# Altium schematic symbol library jlcpcb_2025_04_capacitors_extended_0805.schlib: 3281 symbols (part 12 of 18) (continued)
## CL21Y475KBBVPNE
designator C?  Capacitance: 4.7uF  (hidden comment: *)
Capacitor, Ceramic (MLCC), 4.7uF, ±10%, 50V, X7S, ±10%, SMD 0805; Manufacturer: Samsung Electro-Mechanics; Manufacturer Part Number: CL21Y475KBBVPNE; Package Size: 0805; JLCPCB Basic Part: No; JLCPCB Part Number: C3882018; Supplier 1: LCSC; Category: Capacitors - MLCC; Supplier Part Number 1: C3882018; Tolerance: ±10%; Voltage Rating: 50V; Temperature Coefficient: X7S; RoHS: Yes; ComponentLink1Description: Datasheet; ComponentLink2Description: JLCPCB Part URL; ComponentLink2URL: https://jlcpcb.com/partdetail/C3882018; ComponentLink3Description: LCSC Part URL; ComponentLink3URL: https://lcsc.com/product-detail/Multilayer-Ceramic-Capacitors-MLCC---SMD-SMT_Samsung-Electro-Mechanics-Samsung-Electro-Mechanics-CL21Y475KBBVPNE_C3882018.html; ComponentLink4Description: Samsung Component Library; ComponentLink4URL: https://weblib.samsungsem.com/mlcc/mlcc-ec.do?partNumber=CL21Y475KBBVPN
footprint CAP-0805 (0805 (2012M) Capacitor)
pins: 1, 2

## CS0805KKX7R0BB104
designator C?  Capacitance: 100nF  (hidden comment: *)
Capacitor, Ceramic (MLCC), 100nF, ±10%, 100V, X7R, ±10%, SMD 0805; Manufacturer: YAGEO; Manufacturer Part Number: CS0805KKX7R0BB104; Package Size: 0805; JLCPCB Basic Part: No; JLCPCB Part Number: C2171846; Supplier 1: LCSC; Category: Capacitors - MLCC; Supplier Part Number 1: C2171846; Tolerance: ±10%; Voltage Rating: 100V; Temperature Coefficient: X7R; RoHS: Yes; ComponentLink1Description: Datasheet; ComponentLink1URL: https://wmsc.lcsc.com/wmsc/upload/file/pdf/v2/lcsc/2202040530_YAGEO-CS0805KKX7R0BB104_C2171846.pdf; ComponentLink2Description: JLCPCB Part URL; ComponentLink2URL: https://jlcpcb.com/partdetail/C2171846; ComponentLink3Description: LCSC Part URL; ComponentLink3URL: https://lcsc.com/product-detail/Multilayer-Ceramic-Capacitors-MLCC---SMD-SMT_YAGEO-YAGEO-CS0805KKX7R0BB104_C2171846.html
footprint CAP-0805 (0805 (2012M) Capacitor)
pins: 1, 2

## CS0805KKX7R7BB225
designator C?  Capacitance: 2.2uF  (hidden comment: *)
Capacitor, Ceramic (MLCC), 2.2uF, ±10%, 16V, X7R, ±10%, SMD 0805; Manufacturer: YAGEO; Manufacturer Part Number: CS0805KKX7R7BB225; Package Size: 0805; JLCPCB Basic Part: No; JLCPCB Part Number: C577425; Supplier 1: LCSC; Category: Capacitors - MLCC; Supplier Part Number 1: C577425; Tolerance: ±10%; Voltage Rating: 16V; Temperature Coefficient: X7R; RoHS: Yes; ComponentLink1Description: Datasheet; ComponentLink1URL: https://wmsc.lcsc.com/wmsc/upload/file/pdf/v2/lcsc/2209061800_YAGEO-CS0805KKX7R7BB225_C577425.pdf; ComponentLink2Description: JLCPCB Part URL; ComponentLink2URL: https://jlcpcb.com/partdetail/C577425; ComponentLink3Description: LCSC Part URL; ComponentLink3URL: https://lcsc.com/product-detail/Multilayer-Ceramic-Capacitors-MLCC---SMD-SMT_YAGEO-YAGEO-CS0805KKX7R7BB225_C577425.html
footprint CAP-0805 (0805 (2012M) Capacitor)
pins: 1, 2

## CS0805KKX7R8BB105
designator C?  Capacitance: 1uF  (hidden comment: *)
Capacitor, Ceramic (MLCC), 1uF, ±10%, 25V, X7R, ±10%, SMD 0805; Manufacturer: YAGEO; Manufacturer Part Number: CS0805KKX7R8BB105; Package Size: 0805; JLCPCB Basic Part: No; JLCPCB Part Number: C272869; Supplier 1: LCSC; Category: Capacitors - MLCC; Supplier Part Number 1: C272869; Tolerance: ±10%; Voltage Rating: 25V; Temperature Coefficient: X7R; RoHS: Yes; ComponentLink1Description: Datasheet; ComponentLink1URL: https://wmsc.lcsc.com/wmsc/upload/file/pdf/v2/lcsc/2304140030_YAGEO-CS0805KKX7R8BB105_C272869.pdf; ComponentLink2Description: JLCPCB Part URL; ComponentLink2URL: https://jlcpcb.com/partdetail/C272869; ComponentLink3Description: LCSC Part URL; ComponentLink3URL: https://lcsc.com/product-detail/Multilayer-Ceramic-Capacitors-MLCC---SMD-SMT_YAGEO-YAGEO-CS0805KKX7R8BB105_C272869.html
footprint CAP-0805 (0805 (2012M) Capacitor)
pins: 1, 2

## CS0805KRX7R9BB103
designator C?  Capacitance: 10nF  (hidden comment: *)
Capacitor, Ceramic (MLCC), 10nF, ±10%, 50V, X7R, ±10%, SMD 0805; Manufacturer: YAGEO; Manufacturer Part Number: CS0805KRX7R9BB103; Package Size: 0805; JLCPCB Basic Part: No; JLCPCB Part Number: C326783; Supplier 1: LCSC; Category: Capacitors - MLCC; Supplier Part Number 1: C326783; Tolerance: ±10%; Voltage Rating: 50V; Temperature Coefficient: X7R; RoHS: Yes; ComponentLink1Description: Datasheet; ComponentLink1URL: https://wmsc.lcsc.com/wmsc/upload/file/pdf/v2/lcsc/1811151648_YAGEO-CS0805KRX7R9BB103_C326783.pdf; ComponentLink2Description: JLCPCB Part URL; ComponentLink2URL: https://jlcpcb.com/partdetail/C326783; ComponentLink3Description: LCSC Part URL; ComponentLink3URL: https://lcsc.com/product-detail/Multilayer-Ceramic-Capacitors-MLCC---SMD-SMT_YAGEO-YAGEO-CS0805KRX7R9BB103_C326783.html
footprint CAP-0805 (0805 (2012M) Capacitor)
pins: 1, 2

## CS0805KRX7RCBB102
designator C?  Capacitance: 1nF  (hidden comment: *)
Capacitor, Ceramic (MLCC), 1nF, ±10%, 1kV, X7R, ±10%, SMD 0805; Manufacturer: YAGEO; Manufacturer Part Number: CS0805KRX7RCBB102; Package Size: 0805; JLCPCB Basic Part: No; JLCPCB Part Number: C1855388; Supplier 1: LCSC; Category: Capacitors - MLCC; Supplier Part Number 1: C1855388; Tolerance: ±10%; Voltage Rating: 1kV; Temperature Coefficient: X7R; RoHS: Yes; ComponentLink1Description: Datasheet; ComponentLink1URL: https://wmsc.lcsc.com/wmsc/upload/file/pdf/v2/lcsc/2201271230_YAGEO-CS0805KRX7RCBB102_C1855388.pdf; ComponentLink2Description: JLCPCB Part URL; ComponentLink2URL: https://jlcpcb.com/partdetail/C1855388; ComponentLink3Description: LCSC Part URL; ComponentLink3URL: https://lcsc.com/product-detail/Multilayer-Ceramic-Capacitors-MLCC---SMD-SMT_YAGEO-YAGEO-CS0805KRX7RCBB102_C1855388.html
footprint CAP-0805 (0805 (2012M) Capacitor)
pins: 1, 2

## CS2012X5R225K500NRE
designator C?  Capacitance: 2.2uF  (hidden comment: *)
Capacitor, Ceramic (MLCC), 2.2uF, ±10%, 50V, X5R, ±10%, SMD 0805; Manufacturer: Samwha Capacitor; Manufacturer Part Number: CS2012X5R225K500NRE; Package Size: 0805; JLCPCB Basic Part: No; JLCPCB Part Number: C513763; Supplier 1: LCSC; Category: Capacitors - MLCC; Supplier Part Number 1: C513763; Tolerance: ±10%; Voltage Rating: 50V; Temperature Coefficient: X5R; RoHS: Yes; ComponentLink1Description: Datasheet; ComponentLink1URL: https://wmsc.lcsc.com/wmsc/upload/file/pdf/v2/lcsc/2304140030_Samwha-Capacitor-CS2012X5R225K500NRE_C513763.pdf; ComponentLink2Description: JLCPCB Part URL; ComponentLink2URL: https://jlcpcb.com/partdetail/C513763; ComponentLink3Description: LCSC Part URL; ComponentLink3URL: https://lcsc.com/product-detail/Multilayer-Ceramic-Capacitors-MLCC---SMD-SMT_Samwha-Capacitor-Samwha-Capacitor-CS2012X5R225K500NRE_C513763.html
footprint CAP-0805 (0805 (2012M) Capacitor)
pins: 1, 2

## CS2012X5R226M160NRE
designator C?  Capacitance: 22uF  (hidden comment: *)
Capacitor, Ceramic (MLCC), 22uF, 16V, X5R, SMD 0805; Manufacturer: Samwha Capacitor; Manufacturer Part Number: CS2012X5R226M160NRE; Package Size: 0805; JLCPCB Basic Part: No; JLCPCB Part Number: C2918507; Supplier 1: LCSC; Category: Capacitors - MLCC; Supplier Part Number 1: C2918507; Voltage Rating: 16V; Temperature Coefficient: X5R; RoHS: Yes; ComponentLink1Description: Datasheet; ComponentLink1URL: https://wmsc.lcsc.com/wmsc/upload/file/pdf/v2/lcsc/2111172030_Samwha-Capacitor-CS2012X5R226M160NRE_C2918507.pdf; ComponentLink2Description: JLCPCB Part URL; ComponentLink2URL: https://jlcpcb.com/partdetail/C2918507; ComponentLink3Description: LCSC Part URL; ComponentLink3URL: https://lcsc.com/product-detail/Multilayer-Ceramic-Capacitors-MLCC---SMD-SMT_Samwha-Capacitor-Samwha-Capacitor-CS2012X5R226M160NRE_C2918507.html
footprint CAP-0805 (0805 (2012M) Capacitor)
pins: 1, 2

## CS2012X5R475K250NRE
designator C?  Capacitance: 4.7uF  (hidden comment: *)
Capacitor, Ceramic (MLCC), 4.7uF, ±10%, 25V, X5R, ±10%, SMD 0805; Manufacturer: Samwha Capacitor; Manufacturer Part Number: CS2012X5R475K250NRE; Package Size: 0805; JLCPCB Basic Part: No; JLCPCB Part Number: C2918489; Supplier 1: LCSC; Category: Capacitors - MLCC; Supplier Part Number 1: C2918489; Tolerance: ±10%; Voltage Rating: 25V; Temperature Coefficient: X5R; RoHS: Yes; ComponentLink1Description: Datasheet; ComponentLink1URL: https://wmsc.lcsc.com/wmsc/upload/file/pdf/v2/lcsc/2111172030_Samwha-Capacitor-CS2012X5R475K250NRE_C2918489.pdf; ComponentLink2Description: JLCPCB Part URL; ComponentLink2URL: https://jlcpcb.com/partdetail/C2918489; ComponentLink3Description: LCSC Part URL; ComponentLink3URL: https://lcsc.com/product-detail/Multilayer-Ceramic-Capacitors-MLCC---SMD-SMT_Samwha-Capacitor-Samwha-Capacitor-CS2012X5R475K250NRE_C2918489.html
footprint CAP-0805 (0805 (2012M) Capacitor)
pins: 1, 2

## CS2012X5R475K500NRE
designator C?  Capacitance: 4.7uF  (hidden comment: *)
Capacitor, Ceramic (MLCC), 4.7uF, ±10%, 50V, X5R, ±10%, SMD 0805; Manufacturer: Samwha Capacitor; Manufacturer Part Number: CS2012X5R475K500NRE; Package Size: 0805; JLCPCB Basic Part: No; JLCPCB Part Number: C513770; Supplier 1: LCSC; Category: Capacitors - MLCC; Supplier Part Number 1: C513770; Tolerance: ±10%; Voltage Rating: 50V; Temperature Coefficient: X5R; RoHS: Yes; ComponentLink1Description: Datasheet; ComponentLink1URL: https://wmsc.lcsc.com/wmsc/upload/file/pdf/v2/lcsc/2304140030_Samwha-Capacitor-CS2012X5R475K500NRE_C513770.pdf; ComponentLink2Description: JLCPCB Part URL; ComponentLink2URL: https://jlcpcb.com/partdetail/C513770; ComponentLink3Description: LCSC Part URL; ComponentLink3URL: https://lcsc.com/product-detail/Multilayer-Ceramic-Capacitors-MLCC---SMD-SMT_Samwha-Capacitor-Samwha-Capacitor-CS2012X5R475K500NRE_C513770.html
footprint CAP-0805 (0805 (2012M) Capacitor)
pins: 1, 2

## CS2012X7R104K500NRB
designator C?  Capacitance: 100nF  (hidden comment: *)
Capacitor, Ceramic (MLCC), 100nF, ±10%, 50V, X7R, ±10%, SMD 0805; Manufacturer: Samwha Capacitor; Manufacturer Part Number: CS2012X7R104K500NRB; Package Size: 0805; JLCPCB Basic Part: No; JLCPCB Part Number: C2909631; Supplier 1: LCSC; Category: Capacitors - MLCC; Supplier Part Number 1: C2909631; Tolerance: ±10%; Voltage Rating: 50V; Temperature Coefficient: X7R; RoHS: Yes; ComponentLink1Description: Datasheet; ComponentLink1URL: https://wmsc.lcsc.com/wmsc/upload/file/pdf/v2/lcsc/2110272130_Samwha-Capacitor-CS2012X7R104K500NRB_C2909631.pdf; ComponentLink2Description: JLCPCB Part URL; ComponentLink2URL: https://jlcpcb.com/partdetail/C2909631; ComponentLink3Description: LCSC Part URL; ComponentLink3URL: https://lcsc.com/product-detail/Multilayer-Ceramic-Capacitors-MLCC---SMD-SMT_Samwha-Capacitor-Samwha-Capacitor-CS2012X7R104K500NRB_C2909631.html
footprint CAP-0805 (0805 (2012M) Capacitor)
pins: 1, 2

## CS2012X7R105K500NRE
designator C?  Capacitance: 1uF  (hidden comment: *)
Capacitor, Ceramic (MLCC), 1uF, ±10%, 50V, X7R, ±10%, SMD 0805; Manufacturer: Samwha Capacitor; Manufacturer Part Number: CS2012X7R105K500NRE; Package Size: 0805; JLCPCB Basic Part: No; JLCPCB Part Number: C516002; Supplier 1: LCSC; Category: Capacitors - MLCC; Supplier Part Number 1: C516002; Tolerance: ±10%; Voltage Rating: 50V; Temperature Coefficient: X7R; RoHS: Yes; ComponentLink1Description: Datasheet; ComponentLink1URL: https://wmsc.lcsc.com/wmsc/upload/file/pdf/v2/lcsc/2304140030_Samwha-Capacitor-CS2012X7R105K500NRE_C516002.pdf; ComponentLink2Description: JLCPCB Part URL; ComponentLink2URL: https://jlcpcb.com/partdetail/C516002; ComponentLink3Description: LCSC Part URL; ComponentLink3URL: https://lcsc.com/product-detail/Multilayer-Ceramic-Capacitors-MLCC---SMD-SMT_Samwha-Capacitor-Samwha-Capacitor-CS2012X7R105K500NRE_C516002.html
footprint CAP-0805 (0805 (2012M) Capacitor)
pins: 1, 2

## CS2012X7R106K100NRE
designator C?  Capacitance: 10uF  (hidden comment: *)
Capacitor, Ceramic (MLCC), 10uF, ±10%, 10V, ±10%, SMD 0805; Manufacturer: Samwha Capacitor; Manufacturer Part Number: CS2012X7R106K100NRE; Package Size: 0805; JLCPCB Basic Part: No; JLCPCB Part Number: C1222438; Supplier 1: LCSC; Category: Capacitors - MLCC; Supplier Part Number 1: C1222438; Tolerance: ±10%; Voltage Rating: 10V; RoHS: Yes; ComponentLink1Description: Datasheet; ComponentLink1URL: https://wmsc.lcsc.com/wmsc/upload/file/pdf/v2/lcsc/2012172040_Samwha-Capacitor-CS2012X7R106K100NRE_C1222438.pdf; ComponentLink2Description: JLCPCB Part URL; ComponentLink2URL: https://jlcpcb.com/partdetail/C1222438; ComponentLink3Description: LCSC Part URL; ComponentLink3URL: https://lcsc.com/product-detail/Multilayer-Ceramic-Capacitors-MLCC---SMD-SMT_Samwha-Capacitor-Samwha-Capacitor-CS2012X7R106K100NRE_C1222438.html
footprint CAP-0805 (0805 (2012M) Capacitor)
pins: 1, 2

## CS2012X7R106M100NRE
designator C?  Capacitance: 10uF  (hidden comment: *)
Capacitor, Ceramic (MLCC), 10uF, ±20%, 10V, X7R, ±20%, SMD 0805; Manufacturer: Samwha Capacitor; Manufacturer Part Number: CS2012X7R106M100NRE; Package Size: 0805; JLCPCB Basic Part: No; JLCPCB Part Number: C5189822; Supplier 1: LCSC; Category: Capacitors - MLCC; Supplier Part Number 1: C5189822; Tolerance: ±20%; Voltage Rating: 10V; Temperature Coefficient: X7R; RoHS: Yes; ComponentLink1Description: Datasheet; ComponentLink1URL: https://wmsc.lcsc.com/wmsc/upload/file/pdf/v2/lcsc/2210121101_Samwha-Capacitor-CS2012X7R106M100NRE_C5189822.pdf; ComponentLink2Description: JLCPCB Part URL; ComponentLink2URL: https://jlcpcb.com/partdetail/C5189822; ComponentLink3Description: LCSC Part URL; ComponentLink3URL: https://lcsc.com/product-detail/Multilayer-Ceramic-Capacitors-MLCC---SMD-SMT_Samwha-Capacitor-Samwha-Capacitor-CS2012X7R106M100NRE_C5189822.html
footprint CAP-0805 (0805 (2012M) Capacitor)
pins: 1, 2

## CS2012X7R224K500NRE
designator C?  Capacitance: 220nF  (hidden comment: *)
Capacitor, Ceramic (MLCC), 220nF, ±10%, 50V, X7R, ±10%, SMD 0805; Manufacturer: Samwha Capacitor; Manufacturer Part Number: CS2012X7R224K500NRE; Package Size: 0805; JLCPCB Basic Part: No; JLCPCB Part Number: C2909632; Supplier 1: LCSC; Category: Capacitors - MLCC; Supplier Part Number 1: C2909632; Tolerance: ±10%; Voltage Rating: 50V; Temperature Coefficient: X7R; RoHS: Yes; ComponentLink1Description: Datasheet; ComponentLink1URL: https://wmsc.lcsc.com/wmsc/upload/file/pdf/v2/lcsc/2110272130_Samwha-Capacitor-CS2012X7R224K500NRE_C2909632.pdf; ComponentLink2Description: JLCPCB Part URL; ComponentLink2URL: https://jlcpcb.com/partdetail/C2909632; ComponentLink3Description: LCSC Part URL; ComponentLink3URL: https://lcsc.com/product-detail/Multilayer-Ceramic-Capacitors-MLCC---SMD-SMT_Samwha-Capacitor-Samwha-Capacitor-CS2012X7R224K500NRE_C2909632.html
footprint CAP-0805 (0805 (2012M) Capacitor)
pins: 1, 2

## CS2012X7R225K250NRE
designator C?  Capacitance: 2.2uF  (hidden comment: *)
Capacitor, Ceramic (MLCC), 2.2uF, ±10%, 25V, ±10%, SMD 0805; Manufacturer: Samwha Capacitor; Manufacturer Part Number: CS2012X7R225K250NRE; Package Size: 0805; JLCPCB Basic Part: No; JLCPCB Part Number: C513773; Supplier 1: LCSC; Category: Capacitors - MLCC; Supplier Part Number 1: C513773; Tolerance: ±10%; Voltage Rating: 25V; RoHS: Yes; ComponentLink1Description: Datasheet; ComponentLink1URL: https://wmsc.lcsc.com/wmsc/upload/file/pdf/v2/lcsc/2012171837_Samwha-Capacitor-CS2012X7R225K250NRE_C513773.pdf; ComponentLink2Description: JLCPCB Part URL; ComponentLink2URL: https://jlcpcb.com/partdetail/C513773; ComponentLink3Description: LCSC Part URL; ComponentLink3URL: https://lcsc.com/product-detail/Multilayer-Ceramic-Capacitors-MLCC---SMD-SMT_Samwha-Capacitor-Samwha-Capacitor-CS2012X7R225K250NRE_C513773.html
footprint CAP-0805 (0805 (2012M) Capacitor)
pins: 1, 2

## CS2012X7R334K500NRE
designator C?  Capacitance: 330nF  (hidden comment: *)
Capacitor, Ceramic (MLCC), 330nF, ±10%, 50V, X7R, ±10%, SMD 0805; Manufacturer: Samwha Capacitor; Manufacturer Part Number: CS2012X7R334K500NRE; Package Size: 0805; JLCPCB Basic Part: No; JLCPCB Part Number: C2985038; Supplier 1: LCSC; Category: Capacitors - MLCC; Supplier Part Number 1: C2985038; Tolerance: ±10%; Voltage Rating: 50V; Temperature Coefficient: X7R; RoHS: Yes; ComponentLink1Description: Datasheet; ComponentLink1URL: https://wmsc.lcsc.com/wmsc/upload/file/pdf/v2/lcsc/2206061700_Samwha-Capacitor-CS2012X7R334K500NRE_C2985038.pdf; ComponentLink2Description: JLCPCB Part URL; ComponentLink2URL: https://jlcpcb.com/partdetail/C2985038; ComponentLink3Description: LCSC Part URL; ComponentLink3URL: https://lcsc.com/product-detail/Multilayer-Ceramic-Capacitors-MLCC---SMD-SMT_Samwha-Capacitor-Samwha-Capacitor-CS2012X7R334K500NRE_C2985038.html
footprint CAP-0805 (0805 (2012M) Capacitor)
pins: 1, 2

## CS2012X7R474K500NRE
designator C?  Capacitance: 470nF  (hidden comment: *)
Capacitor, Ceramic (MLCC), 470nF, 50V, X7R, SMD 0805; Manufacturer: Samwha Capacitor; Manufacturer Part Number: CS2012X7R474K500NRE; Package Size: 0805; JLCPCB Basic Part: No; JLCPCB Part Number: C2909633; Supplier 1: LCSC; Category: Capacitors - MLCC; Supplier Part Number 1: C2909633; Voltage Rating: 50V; Temperature Coefficient: X7R; RoHS: Yes; ComponentLink1Description: Datasheet; ComponentLink1URL: https://wmsc.lcsc.com/wmsc/upload/file/pdf/v2/lcsc/2110272130_Samwha-Capacitor-CS2012X7R474K500NRE_C2909633.pdf; ComponentLink2Description: JLCPCB Part URL; ComponentLink2URL: https://jlcpcb.com/partdetail/C2909633; ComponentLink3Description: LCSC Part URL; ComponentLink3URL: https://lcsc.com/product-detail/Multilayer-Ceramic-Capacitors-MLCC---SMD-SMT_Samwha-Capacitor-Samwha-Capacitor-CS2012X7R474K500NRE_C2909633.html
footprint CAP-0805 (0805 (2012M) Capacitor)
pins: 1, 2

## CS2012X7R475K250NRE
designator C?  Capacitance: 4.7uF  (hidden comment: *)
Capacitor, Ceramic (MLCC), 4.7uF, ±10%, 25V, X7R, ±10%, SMD 0805; Manufacturer: Samwha Capacitor; Manufacturer Part Number: CS2012X7R475K250NRE; Package Size: 0805; JLCPCB Basic Part: No; JLCPCB Part Number: C513766; Supplier 1: LCSC; Category: Capacitors - MLCC; Supplier Part Number 1: C513766; Tolerance: ±10%; Voltage Rating: 25V; Temperature Coefficient: X7R; RoHS: Yes; ComponentLink1Description: Datasheet; ComponentLink1URL: https://wmsc.lcsc.com/wmsc/upload/file/pdf/v2/lcsc/2005291832_Samwha-Capacitor-CS2012X7R475K250NRE_C513766.pdf; ComponentLink2Description: JLCPCB Part URL; ComponentLink2URL: https://jlcpcb.com/partdetail/C513766; ComponentLink3Description: LCSC Part URL; ComponentLink3URL: https://lcsc.com/product-detail/Multilayer-Ceramic-Capacitors-MLCC---SMD-SMT_Samwha-Capacitor-Samwha-Capacitor-CS2012X7R475K250NRE_C513766.html
footprint CAP-0805 (0805 (2012M) Capacitor)
pins: 1, 2

## CS2012X7R475K350NRE
designator C?  Capacitance: 4.7uF  (hidden comment: *)
Capacitor, Ceramic (MLCC), 4.7uF, ±10%, 35V, X7R, ±10%, SMD 0805; Manufacturer: Samwha Capacitor; Manufacturer Part Number: CS2012X7R475K350NRE; Package Size: 0805; JLCPCB Basic Part: No; JLCPCB Part Number: C560882; Supplier 1: LCSC; Category: Capacitors - MLCC; Supplier Part Number 1: C560882; Tolerance: ±10%; Voltage Rating: 35V; Temperature Coefficient: X7R; RoHS: Yes; ComponentLink1Description: Datasheet; ComponentLink1URL: https://wmsc.lcsc.com/wmsc/upload/file/pdf/v2/lcsc/2005300141_Samwha-Capacitor-CS2012X7R475K350NRE_C560882.pdf; ComponentLink2Description: JLCPCB Part URL; ComponentLink2URL: https://jlcpcb.com/partdetail/C560882; ComponentLink3Description: LCSC Part URL; ComponentLink3URL: https://lcsc.com/product-detail/Multilayer-Ceramic-Capacitors-MLCC---SMD-SMT_Samwha-Capacitor-Samwha-Capacitor-CS2012X7R475K350NRE_C560882.html
footprint CAP-0805 (0805 (2012M) Capacitor)
pins: 1, 2

## CSA0805X5R106K160MT
designator C?  Capacitance: 10000000pF  (hidden comment: *)
Capacitor, Ceramic (MLCC), 10000000pF, ±10%, 16V, X5R, ±10%, SMD 0805; Manufacturer: HRE; Manufacturer Part Number: CSA0805X5R106K160MT; Package Size: 0805; JLCPCB Basic Part: No; JLCPCB Part Number: C3015161; Supplier 1: LCSC; Category: Capacitors - MLCC; Supplier Part Number 1: C3015161; Tolerance: ±10%; Voltage Rating: 16V; Temperature Coefficient: X5R; RoHS: Yes; ComponentLink1Description: Datasheet; ComponentLink1URL: https://wmsc.lcsc.com/wmsc/upload/file/pdf/v2/lcsc/2208051100_HRE-CSA0805X5R106K160MT_C3015161.pdf; ComponentLink2Description: JLCPCB Part URL; ComponentLink2URL: https://jlcpcb.com/partdetail/C3015161; ComponentLink3Description: LCSC Part URL; ComponentLink3URL: https://lcsc.com/product-detail/Multilayer-Ceramic-Capacitors-MLCC---SMD-SMT_HRE-HRE-CSA0805X5R106K160MT_C3015161.html
footprint CAP-0805 (0805 (2012M) Capacitor)
pins: 1, 2

## CSA0805X5R226M6R3MT
designator C?  Capacitance: 22uF  (hidden comment: *)
Capacitor, Ceramic (MLCC), 22uF, ±20%, 6.3V, X5R, ±20%, SMD 0805; Manufacturer: HRE; Manufacturer Part Number: CSA0805X5R226M6R3MT; Package Size: 0805; JLCPCB Basic Part: No; JLCPCB Part Number: C3015162; Supplier 1: LCSC; Category: Capacitors - MLCC; Supplier Part Number 1: C3015162; Tolerance: ±20%; Voltage Rating: 6.3V; Temperature Coefficient: X5R; RoHS: Yes; ComponentLink1Description: Datasheet; ComponentLink1URL: https://wmsc.lcsc.com/wmsc/upload/file/pdf/v2/lcsc/2208051100_HRE-CSA0805X5R226M6R3MT_C3015162.pdf; ComponentLink2Description: JLCPCB Part URL; ComponentLink2URL: https://jlcpcb.com/partdetail/C3015162; ComponentLink3Description: LCSC Part URL; ComponentLink3URL: https://lcsc.com/product-detail/Multilayer-Ceramic-Capacitors-MLCC---SMD-SMT_HRE-HRE-CSA0805X5R226M6R3MT_C3015162.html
footprint CAP-0805 (0805 (2012M) Capacitor)
pins: 1, 2

## CSA0805X7R103K500KT
designator C?  Capacitance: 10nF  (hidden comment: *)
Capacitor, Ceramic (MLCC), 10nF, ±10%, 50V, X7R, ±10%, SMD 0805; Manufacturer: HRE; Manufacturer Part Number: CSA0805X7R103K500KT; Package Size: 0805; JLCPCB Basic Part: No; JLCPCB Part Number: C3015138; Supplier 1: LCSC; Category: Capacitors - MLCC; Supplier Part Number 1: C3015138; Tolerance: ±10%; Voltage Rating: 50V; Temperature Coefficient: X7R; RoHS: Yes; ComponentLink1Description: Datasheet; ComponentLink1URL: https://wmsc.lcsc.com/wmsc/upload/file/pdf/v2/lcsc/2208051100_HRE-CSA0805X7R103K500KT_C3015138.pdf; ComponentLink2Description: JLCPCB Part URL; ComponentLink2URL: https://jlcpcb.com/partdetail/C3015138; ComponentLink3Description: LCSC Part URL; ComponentLink3URL: https://lcsc.com/product-detail/Multilayer-Ceramic-Capacitors-MLCC---SMD-SMT_HRE-HRE-CSA0805X7R103K500KT_C3015138.html
footprint CAP-0805 (0805 (2012M) Capacitor)
pins: 1, 2

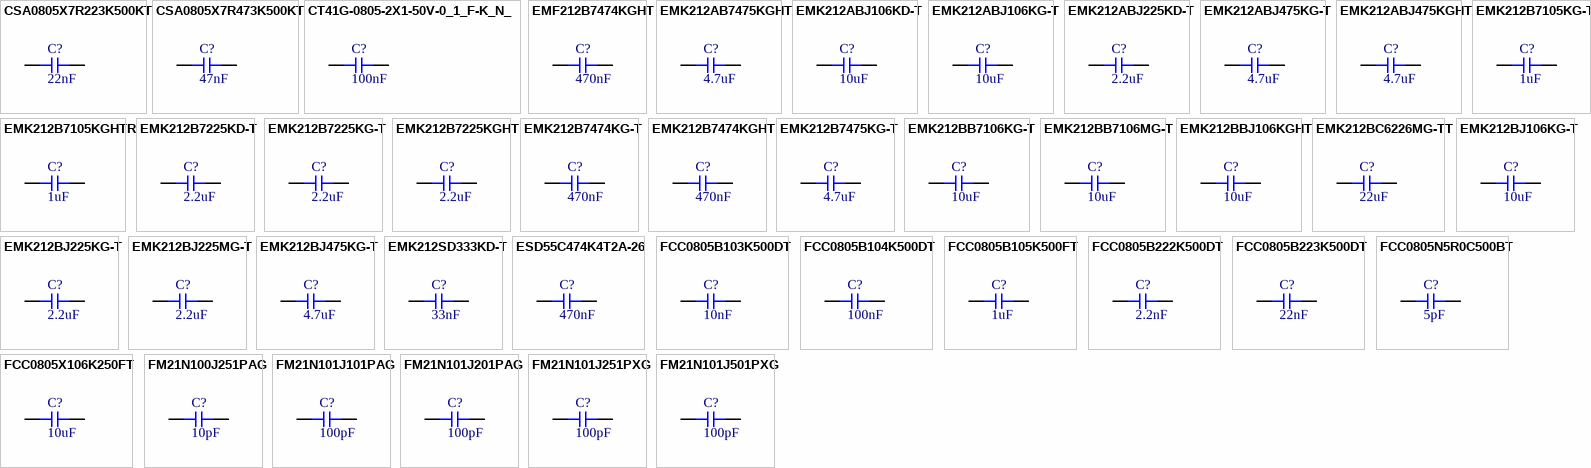
[diagram p55: symbols CSA0805X7R223K500KT to FM21N101J501PXG]

## CSA0805X7R223K500KT
designator C?  Capacitance: 22nF  (hidden comment: *)
Capacitor, Ceramic (MLCC), 22nF, ±10%, 50V, X7R, ±10%, SMD 0805; Manufacturer: HRE; Manufacturer Part Number: CSA0805X7R223K500KT; Package Size: 0805; JLCPCB Basic Part: No; JLCPCB Part Number: C3015147; Supplier 1: LCSC; Category: Capacitors - MLCC; Supplier Part Number 1: C3015147; Tolerance: ±10%; Voltage Rating: 50V; Temperature Coefficient: X7R; RoHS: Yes; ComponentLink1Description: Datasheet; ComponentLink1URL: https://wmsc.lcsc.com/wmsc/upload/file/pdf/v2/lcsc/2208051100_HRE-CSA0805X7R223K500KT_C3015147.pdf; ComponentLink2Description: JLCPCB Part URL; ComponentLink2URL: https://jlcpcb.com/partdetail/C3015147; ComponentLink3Description: LCSC Part URL; ComponentLink3URL: https://lcsc.com/product-detail/Multilayer-Ceramic-Capacitors-MLCC---SMD-SMT_HRE-HRE-CSA0805X7R223K500KT_C3015147.html
footprint CAP-0805 (0805 (2012M) Capacitor)
pins: 1, 2

## CSA0805X7R473K500KT
designator C?  Capacitance: 47nF  (hidden comment: *)
Capacitor, Ceramic (MLCC), 47nF, ±10%, 50V, X7R, ±10%, SMD 0805; Manufacturer: HRE; Manufacturer Part Number: CSA0805X7R473K500KT; Package Size: 0805; JLCPCB Basic Part: No; JLCPCB Part Number: C3015148; Supplier 1: LCSC; Category: Capacitors - MLCC; Supplier Part Number 1: C3015148; Tolerance: ±10%; Voltage Rating: 50V; Temperature Coefficient: X7R; RoHS: Yes; ComponentLink1Description: Datasheet; ComponentLink1URL: https://wmsc.lcsc.com/wmsc/upload/file/pdf/v2/lcsc/2208051100_HRE-CSA0805X7R473K500KT_C3015148.pdf; ComponentLink2Description: JLCPCB Part URL; ComponentLink2URL: https://jlcpcb.com/partdetail/C3015148; ComponentLink3Description: LCSC Part URL; ComponentLink3URL: https://lcsc.com/product-detail/Multilayer-Ceramic-Capacitors-MLCC---SMD-SMT_HRE-HRE-CSA0805X7R473K500KT_C3015148.html
footprint CAP-0805 (0805 (2012M) Capacitor)
pins: 1, 2

## CT41G-0805-2X1-50V-0_1_F-K_N_
designator C?  Capacitance: 100nF  (hidden comment: *)
Capacitor, Ceramic (MLCC), 100nF, ±10%, 50V, 2X1, ±10%, SMD 0805; Manufacturer: TORCH; Manufacturer Part Number: CT41G-0805-2X1-50V-0.1μF-K(N); Package Size: 0805; JLCPCB Basic Part: No; JLCPCB Part Number: C126469; Supplier 1: LCSC; Category: Capacitors - MLCC; Supplier Part Number 1: C126469; Tolerance: ±10%; Voltage Rating: 50V; Temperature Coefficient: 2X1; RoHS: Yes; ComponentLink1Description: Datasheet; ComponentLink1URL: https://wmsc.lcsc.com/wmsc/upload/file/pdf/v2/lcsc/2304140030_TORCH-CT41G-0805-2X1-50V-0-1-F-K-N_C126469.pdf; ComponentLink2Description: JLCPCB Part URL; ComponentLink2URL: https://jlcpcb.com/partdetail/C126469; ComponentLink3Description: LCSC Part URL; ComponentLink3URL: https://lcsc.com/product-detail/Multilayer-Ceramic-Capacitors-MLCC---SMD-SMT_TORCH-TORCH-CT41G-0805-2X1-50V-0.1%CE%BCF-KN_C126469.html
footprint CAP-0805 (0805 (2012M) Capacitor)
pins: 1, 2

## EMF212B7474KGHT
designator C?  Capacitance: 470nF  (hidden comment: *)
Capacitor, Ceramic (MLCC), 470nF, ±10%, 16V, X7R, ±10%, SMD 0805; Manufacturer: Taiyo Yuden; Manufacturer Part Number: EMF212B7474KGHT; Package Size: 0805; JLCPCB Basic Part: No; JLCPCB Part Number: C651004; Supplier 1: LCSC; Category: Capacitors - MLCC; Supplier Part Number 1: C651004; Tolerance: ±10%; Voltage Rating: 16V; Temperature Coefficient: X7R; RoHS: Yes; ComponentLink1Description: Datasheet; ComponentLink1URL: https://wmsc.lcsc.com/wmsc/upload/file/pdf/v2/lcsc/2304140030_Taiyo-Yuden-EMF212B7474KGHT_C651004.pdf; ComponentLink2Description: JLCPCB Part URL; ComponentLink2URL: https://jlcpcb.com/partdetail/C651004; ComponentLink3Description: LCSC Part URL; ComponentLink3URL: https://lcsc.com/product-detail/Multilayer-Ceramic-Capacitors-MLCC---SMD-SMT_Taiyo-Yuden-Taiyo-Yuden-EMF212B7474KGHT_C651004.html
footprint CAP-0805 (0805 (2012M) Capacitor)
pins: 1, 2

## EMK212AB7475KGHT
designator C?  Capacitance: 4.7uF  (hidden comment: *)
Capacitor, Ceramic (MLCC), 4.7uF, ±10%, 16V, X7R, ±10%, SMD 0805; Manufacturer: Taiyo Yuden; Manufacturer Part Number: EMK212AB7475KGHT; Package Size: 0805; JLCPCB Basic Part: No; JLCPCB Part Number: C412449; Supplier 1: LCSC; Category: Capacitors - MLCC; Supplier Part Number 1: C412449; Tolerance: ±10%; Voltage Rating: 16V; Temperature Coefficient: X7R; RoHS: Yes; ComponentLink1Description: Datasheet; ComponentLink1URL: https://wmsc.lcsc.com/wmsc/upload/file/pdf/v2/lcsc/2211282230_Taiyo-Yuden-EMK212AB7475KGHT_C412449.pdf; ComponentLink2Description: JLCPCB Part URL; ComponentLink2URL: https://jlcpcb.com/partdetail/C412449; ComponentLink3Description: LCSC Part URL; ComponentLink3URL: https://lcsc.com/product-detail/Multilayer-Ceramic-Capacitors-MLCC---SMD-SMT_Taiyo-Yuden-Taiyo-Yuden-EMK212AB7475KGHT_C412449.html
footprint CAP-0805 (0805 (2012M) Capacitor)
pins: 1, 2

## EMK212ABJ106KD-T
designator C?  Capacitance: 10uF  (hidden comment: *)
Capacitor, Ceramic (MLCC), 10uF, ±10%, 16V, X5R, ±10%, SMD 0805; Manufacturer: Taiyo Yuden; Manufacturer Part Number: EMK212ABJ106KD-T; Package Size: 0805; JLCPCB Basic Part: No; JLCPCB Part Number: C385896; Supplier 1: LCSC; Category: Capacitors - MLCC; Supplier Part Number 1: C385896; Tolerance: ±10%; Voltage Rating: 16V; Temperature Coefficient: X5R; RoHS: Yes; ComponentLink1Description: Datasheet; ComponentLink1URL: https://wmsc.lcsc.com/wmsc/upload/file/pdf/v2/lcsc/1912111437_Taiyo-Yuden-EMK212ABJ106KD-T_C385896.pdf; ComponentLink2Description: JLCPCB Part URL; ComponentLink2URL: https://jlcpcb.com/partdetail/C385896; ComponentLink3Description: LCSC Part URL; ComponentLink3URL: https://lcsc.com/product-detail/Multilayer-Ceramic-Capacitors-MLCC---SMD-SMT_Taiyo-Yuden-Taiyo-Yuden-EMK212ABJ106KD-T_C385896.html
footprint CAP-0805 (0805 (2012M) Capacitor)
pins: 1, 2

## EMK212ABJ106KG-T
designator C?  Capacitance: 10uF  (hidden comment: *)
Capacitor, Ceramic (MLCC), 10uF, ±10%, 16V, X5R, ±10%, SMD 0805; Manufacturer: Taiyo Yuden; Manufacturer Part Number: EMK212ABJ106KG-T; Package Size: 0805; JLCPCB Basic Part: No; JLCPCB Part Number: C111662; Supplier 1: LCSC; Category: Capacitors - MLCC; Supplier Part Number 1: C111662; Tolerance: ±10%; Voltage Rating: 16V; Temperature Coefficient: X5R; RoHS: Yes; ComponentLink1Description: Datasheet; ComponentLink1URL: https://wmsc.lcsc.com/wmsc/upload/file/pdf/v2/lcsc/2304140030_Taiyo-Yuden-EMK212ABJ106KG-T_C111662.pdf; ComponentLink2Description: JLCPCB Part URL; ComponentLink2URL: https://jlcpcb.com/partdetail/C111662; ComponentLink3Description: LCSC Part URL; ComponentLink3URL: https://lcsc.com/product-detail/Multilayer-Ceramic-Capacitors-MLCC---SMD-SMT_Taiyo-Yuden-Taiyo-Yuden-EMK212ABJ106KG-T_C111662.html
footprint CAP-0805 (0805 (2012M) Capacitor)
pins: 1, 2

## EMK212ABJ225KD-T
designator C?  Capacitance: 2.2uF  (hidden comment: *)
Capacitor, Ceramic (MLCC), 2.2uF, ±10%, 16V, X5R, ±10%, SMD 0805; Manufacturer: Taiyo Yuden; Manufacturer Part Number: EMK212ABJ225KD-T; Package Size: 0805; JLCPCB Basic Part: No; JLCPCB Part Number: C651021; Supplier 1: LCSC; Category: Capacitors - MLCC; Supplier Part Number 1: C651021; Tolerance: ±10%; Voltage Rating: 16V; Temperature Coefficient: X5R; RoHS: Yes; ComponentLink1Description: Datasheet; ComponentLink1URL: https://wmsc.lcsc.com/wmsc/upload/file/pdf/v2/lcsc/2211282200_Taiyo-Yuden-EMK212ABJ225KD-T_C651021.pdf; ComponentLink2Description: JLCPCB Part URL; ComponentLink2URL: https://jlcpcb.com/partdetail/C651021; ComponentLink3Description: LCSC Part URL; ComponentLink3URL: https://lcsc.com/product-detail/Multilayer-Ceramic-Capacitors-MLCC---SMD-SMT_Taiyo-Yuden-Taiyo-Yuden-EMK212ABJ225KD-T_C651021.html
footprint CAP-0805 (0805 (2012M) Capacitor)
pins: 1, 2

## EMK212ABJ475KG-T
designator C?  Capacitance: 4.7uF  (hidden comment: *)
Capacitor, Ceramic (MLCC), 4.7uF, ±10%, 16V, X5R, ±10%, SMD 0805; Manufacturer: Taiyo Yuden; Manufacturer Part Number: EMK212ABJ475KG-T; Package Size: 0805; JLCPCB Basic Part: No; JLCPCB Part Number: C651027; Supplier 1: LCSC; Category: Capacitors - MLCC; Supplier Part Number 1: C651027; Tolerance: ±10%; Voltage Rating: 16V; Temperature Coefficient: X5R; RoHS: Yes; ComponentLink1Description: Datasheet; ComponentLink1URL: https://wmsc.lcsc.com/wmsc/upload/file/pdf/v2/lcsc/2304140030_Taiyo-Yuden-EMK212ABJ475KG-T_C651027.pdf; ComponentLink2Description: JLCPCB Part URL; ComponentLink2URL: https://jlcpcb.com/partdetail/C651027; ComponentLink3Description: LCSC Part URL; ComponentLink3URL: https://lcsc.com/product-detail/Multilayer-Ceramic-Capacitors-MLCC---SMD-SMT_Taiyo-Yuden-Taiyo-Yuden-EMK212ABJ475KG-T_C651027.html
footprint CAP-0805 (0805 (2012M) Capacitor)
pins: 1, 2

## EMK212ABJ475KGHT
designator C?  Capacitance: 4.7uF  (hidden comment: *)
Capacitor, Ceramic (MLCC), 4.7uF, ±10%, 16V, ±10%, SMD 0805; Manufacturer: Taiyo Yuden; Manufacturer Part Number: EMK212ABJ475KGHT; Package Size: 0805; JLCPCB Basic Part: No; JLCPCB Part Number: C385897; Supplier 1: LCSC; Category: Capacitors - MLCC; Supplier Part Number 1: C385897; Tolerance: ±10%; Voltage Rating: 16V; RoHS: Yes; ComponentLink1Description: Datasheet; ComponentLink1URL: https://wmsc.lcsc.com/wmsc/upload/file/pdf/v2/lcsc/2211282230_Taiyo-Yuden-EMK212ABJ475KGHT_C385897.pdf; ComponentLink2Description: JLCPCB Part URL; ComponentLink2URL: https://jlcpcb.com/partdetail/C385897; ComponentLink3Description: LCSC Part URL; ComponentLink3URL: https://lcsc.com/product-detail/Multilayer-Ceramic-Capacitors-MLCC---SMD-SMT_Taiyo-Yuden-Taiyo-Yuden-EMK212ABJ475KGHT_C385897.html
footprint CAP-0805 (0805 (2012M) Capacitor)
pins: 1, 2

## EMK212B7105KG-T
designator C?  Capacitance: 1uF  (hidden comment: *)
Capacitor, Ceramic (MLCC), 1uF, ±10%, 16V, X7R, ±10%, SMD 0805; Manufacturer: Taiyo Yuden; Manufacturer Part Number: EMK212B7105KG-T; Package Size: 0805; JLCPCB Basic Part: No; JLCPCB Part Number: C87154; Supplier 1: LCSC; Category: Capacitors - MLCC; Supplier Part Number 1: C87154; Tolerance: ±10%; Voltage Rating: 16V; Temperature Coefficient: X7R; RoHS: Yes; ComponentLink1Description: Datasheet; ComponentLink1URL: https://wmsc.lcsc.com/wmsc/upload/file/pdf/v2/lcsc/2304140030_Taiyo-Yuden-EMK212B7105KG-T_C87154.pdf; ComponentLink2Description: JLCPCB Part URL; ComponentLink2URL: https://jlcpcb.com/partdetail/C87154; ComponentLink3Description: LCSC Part URL; ComponentLink3URL: https://lcsc.com/product-detail/Multilayer-Ceramic-Capacitors-MLCC---SMD-SMT_Taiyo-Yuden-Taiyo-Yuden-EMK212B7105KG-T_C87154.html
footprint CAP-0805 (0805 (2012M) Capacitor)
pins: 1, 2

## EMK212B7105KGHTR
designator C?  Capacitance: 1uF  (hidden comment: *)
Capacitor, Ceramic (MLCC), 1uF, ±10%, 16V, X7R, ±10%, SMD 0805; Manufacturer: Taiyo Yuden; Manufacturer Part Number: EMK212B7105KGHTR; Package Size: 0805; JLCPCB Basic Part: No; JLCPCB Part Number: C412450; Supplier 1: LCSC; Category: Capacitors - MLCC; Supplier Part Number 1: C412450; Tolerance: ±10%; Voltage Rating: 16V; Temperature Coefficient: X7R; RoHS: Yes; ComponentLink1Description: Datasheet; ComponentLink1URL: https://wmsc.lcsc.com/wmsc/upload/file/pdf/v2/lcsc/2304140030_Taiyo-Yuden-EMK212B7105KGHTR_C412450.pdf; ComponentLink2Description: JLCPCB Part URL; ComponentLink2URL: https://jlcpcb.com/partdetail/C412450; ComponentLink3Description: LCSC Part URL; ComponentLink3URL: https://lcsc.com/product-detail/Multilayer-Ceramic-Capacitors-MLCC---SMD-SMT_Taiyo-Yuden-Taiyo-Yuden-EMK212B7105KGHTR_C412450.html
footprint CAP-0805 (0805 (2012M) Capacitor)
pins: 1, 2